# Altium footprint library Connector DSUB.PcbLib: 34 footprints (part 1 of 3)
Each footprint in its own frame and in the unit in brackets; x right, y up, seen from the top. Pads: shape width x height; smd on the part's side, far side on the other; paste and mask are expansions set on the pad; w line width, h text height; cw(c..) or ccw(c..) is an arc to the next point about the centre after c.
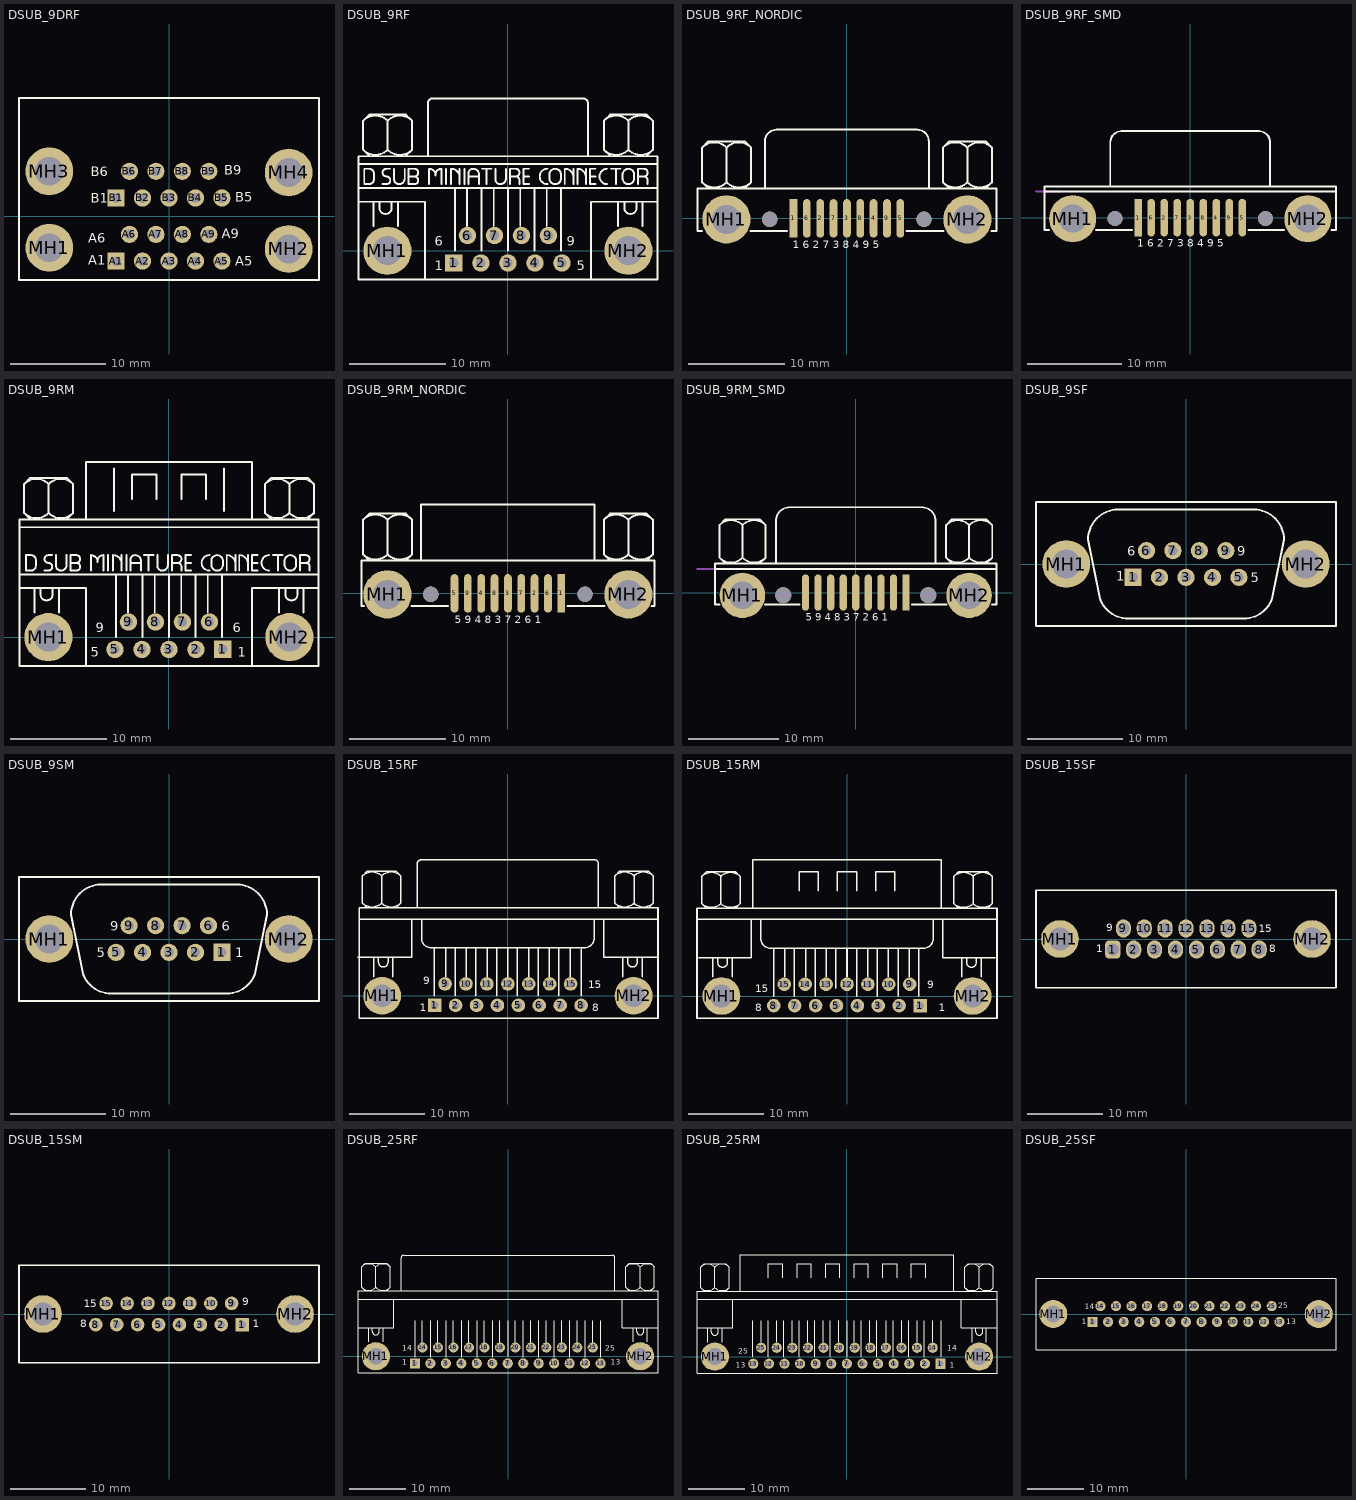
[diagram p0: the footprints below, top view; thin cyan lines are the x and y axes]

## DSUB_9DRF [mm] "CONN, DSUB MINIATURE, DUAL 9PIN, R/A, FEMALE"
pads (22):
  rect 1.8x1.8 hole 1: A1(-5.537,-4.699) B1(-5.537,1.905)
  round 1.8 hole 1: A2(-2.769,-4.699) A3(0,-4.699) A4(2.769,-4.699) A5(5.537,-4.699) A6(-4.14,-1.905) A7(-1.372,-1.905) A8(1.397,-1.905) A9(4.166,-1.905) B2(-2.769,1.905) B3(0,1.905) B4(2.769,1.905) B5(5.537,1.905) B6(-4.14,4.699) B7(-1.372,4.699) B8(1.397,4.699) B9(4.166,4.699)
  round 5 hole 3: MH1(-12.522,-3.302) MH2(12.522,-3.429) MH3(-12.522,4.699) MH4(12.522,4.572)
Top Overlay:
  lines w0.2: -15.697,-6.68 -15.697,12.37 15.697,12.37 15.697,-6.68 -15.697,-6.68
  text "A5" at 6.909,-5.207 h1
  text "A9" at 5.512,-2.286 h1
  text "B5" at 6.909,1.524 h1
  text "B9" at 5.766,4.318 h1
  text "B6" at -8.204,4.191 h1
  text "B1" at -8.204,1.397 h1
  text "A6" at -8.458,-2.794 h1
  text "A1" at -8.458,-5.08 h1

## DSUB_9RF [mm] "CONN, DSUB MINIATURE, 9PIN, R/A, FEMALE"
pads (11):
  rect 1.8x1.8 hole 1 mask+0.1: 1(-5.6,-1.27)
  round 1.8 hole 1 mask+0.1: 2(-2.8,-1.27) 3(0,-1.27) 4(2.8,-1.27) 5(5.6,-1.27) 6(-4.2,1.57) 7(-1.4,1.57) 8(1.4,1.57) 9(4.2,1.57)
  round 5 hole 3: MH1(-12.5,0) MH2(12.5,0)
Top Overlay:
  drawing of 154 lines, arcs and shapes, not listed
  text "9" at 6.107,0.508 h1
  text "5" at 7.123,-2.032 h1
  text "1" at -7.609,-2.032 h1
  text "6" at -7.609,0.508 h1
3D body "D-Sub9rf.stp": height 12.8, standoff -3.65, extent -15.4,-2.9 15.4,15.6

## DSUB_9RF_NORDIC [mm] "CONN, DSUB MINIATURE, 9PIN, R/A, FEMALE, SMD, NORDIC 190-009-263R001"
pads (13):
  rect 0.8x4 smd mask+0.1: 1(-5.54,0)
  oval 0.8x4 smd mask+0.1: 2(-2.77,0) 3(0,0) 4(2.77,0) 5(5.54,0) 6(-4.155,0) 7(-1.385,0) 8(1.385,0) 9(4.155,0)
  round 5 / inner round 3.3 / far side round 5 hole 3 mask+0.1: MH1(-12.5,-0.1) MH2(12.5,-0.1)
  round 1.6 hole 1.6 unplated: ""(-8,-0.1) ""(8,-0.1)
Top Overlay:
  lines w0.2: -15.02,3.744 ccw(c-13.748,5.017) -12.476,3.744 ; -15.02,7.347 cw(c-13.748,6.075) -12.476,7.347 ; -15,-1.3 -15.5,-1.3 -15.5,3.1 15.5,3.1 15.5,-1.3 15,-1.3 ; -14.383,3.112 -15.018,3.747 -15.018,7.345 -14.383,7.98 -10.573,7.98 -9.938,7.345 -9.938,3.747 -10.573,3.112 ; -12.48,3.744 ccw(c-11.208,5.017) -9.936,3.744 ; -12.48,7.347 cw(c-11.208,6.075) -9.936,7.347 ; -12.478,3.747 -12.478,7.345 ; -10,-1.3 -6.2,-1.3 ; -8.5,3.1 -8.5,8 cw(c-7.3,8) -7.3,9.2 7.3,9.2 cw(c7.3,8) 8.5,8 8.5,3.1 ; 6.2,-1.3 10,-1.3 ; 9.957,3.744 ccw(c11.229,5.017) 12.501,3.744 ; 9.957,7.347 cw(c11.229,6.075) 12.501,7.347 ; 10.594,3.112 9.959,3.747 9.959,7.345 10.594,7.98 14.404,7.98 15.039,7.345 15.039,3.747 14.404,3.112 ; 12.497,3.744 ccw(c13.769,5.017) 15.041,3.744 ; 12.497,7.347 cw(c13.769,6.075) 15.041,7.347 ; 12.499,3.747 12.499,7.345
  text "1 6 2 7 3 8 4 9 5" at -5.609,-3.1 h0.8
3D body "190-009-263.STEP": height 10.82, standoff -3.58, extent -15.436,-1.185 15.425,9.127

## DSUB_9RF_SMD [mm] "CONN, DSUB MINIATURE, 9PIN, R/A, FEMALE, KYCON K202XHT-E9S-N"
pads (13):
  rect 0.8x4 smd mask+0.1: 1(-5.54,0)
  oval 0.8x4 smd mask+0.1: 2(-2.77,0) 3(0,0) 4(2.77,0) 5(5.54,0) 6(-4.155,0) 7(-1.385,0) 8(1.385,0) 9(4.155,0)
  round 5 / inner round 3.3 / far side round 5 hole 3 mask+0.1: MH1(-12.5,-0.1) MH2(12.5,-0.1)
  round 1.6 hole 1.6 unplated: ""(-8,-0.1) ""(8,-0.1)
Top Overlay:
  lines w0.2: -15.5,2.8 15.5,2.8 ; -15,-1.3 -15.5,-1.3 -15.5,3.3 15.5,3.3 15.5,-1.3 15,-1.3 ; -10,-1.3 -6.2,-1.3 ; -8.5,3.4 -8.5,8 cw(c-7.3,8) -7.3,9.2 7.3,9.2 cw(c7.3,8) 8.5,8 8.5,3.4 ; 6.2,-1.3 10,-1.3
  text "1 6 2 7 3 8 4 9 5" at -5.609,-3.1 h0.8
Mechanical 1:
  lines w0.2: -16.4,2.8 -13.8,2.8
  text "pcb edge" at -13.5,2.3 h2
3D body "K202XHT-E9S-N_rB2.STEP": height 10.92, standoff -3.32, extent -15.405,-1.1 15.405,9

## DSUB_9RM [mm] "CONN, DSUB MINIATURE, 9PIN, R/A, MALE"
pads (11):
  rect 1.8x1.8 hole 1 mask+0.1: 1(5.6,-1.27)
  round 1.8 hole 1 mask+0.1: 2(2.8,-1.27) 3(0,-1.27) 4(-2.8,-1.27) 5(-5.6,-1.27) 6(4.2,1.57) 7(1.4,1.57) 8(-1.4,1.57) 9(-4.2,1.57)
  round 5 hole 3: MH1(-12.5,0) MH2(12.5,0)
Top Overlay:
  drawing of 160 lines, arcs and shapes, not listed
  text "6" at 6.615,0.508 h1
  text "1" at 7.123,-2.032 h1
  text "5" at -8.117,-2.032 h1
  text "9" at -7.609,0.508 h1
3D body "connector_a-dsub09rm.stp": height 12.57, standoff -4.3, extent -15.405,-2.9 15.405,18

## DSUB_9RM_NORDIC [mm] "CONN, DSUB MINIATURE, 9PIN, R/A, MALE, SMD, NORDIC 190-009-163R001"
pads (13):
  rect 0.8x4 smd mask+0.1: 1(5.54,0)
  oval 0.8x4 smd mask+0.1: 2(2.77,0) 3(0,0) 4(-2.77,0) 5(-5.54,0) 6(4.155,0) 7(1.385,0) 8(-1.385,0) 9(-4.155,0)
  round 5 / inner round 3.3 / far side round 5 hole 3 mask+0.1: MH1(-12.5,-0.1) MH2(12.5,-0.1)
  round 1.6 hole 1.6 unplated: ""(-8,-0.1) ""(8,-0.1)
Top Overlay:
  lines w0.2: -15.02,4.044 ccw(c-13.748,5.317) -12.476,4.044 ; -15.02,7.647 cw(c-13.748,6.375) -12.476,7.647 ; -14.9,-1.3 -15.2,-1.3 -15.2,3.4 15.2,3.4 15.2,-1.3 14.9,-1.3 ; -14.383,3.412 -15.018,4.047 -15.018,7.645 -14.383,8.28 -10.573,8.28 -9.938,7.645 -9.938,4.047 -10.573,3.412 ; -12.48,4.044 ccw(c-11.208,5.317) -9.936,4.044 ; -12.48,7.647 cw(c-11.208,6.375) -9.936,7.647 ; -12.478,4.047 -12.478,7.645 ; -10,-1.3 -6.2,-1.3 ; -9,3.4 -9,9.2 9,9.2 9,3.4 ; 6.2,-1.3 10,-1.3 ; 9.957,4.044 ccw(c11.229,5.317) 12.501,4.044 ; 9.957,7.647 cw(c11.229,6.375) 12.501,7.647 ; 10.594,3.412 9.959,4.047 9.959,7.645 10.594,8.28 14.404,8.28 15.039,7.645 15.039,4.047 14.404,3.412 ; 12.497,4.044 ccw(c13.769,5.317) 15.041,4.044 ; 12.497,7.647 cw(c13.769,6.375) 15.041,7.647 ; 12.499,4.047 12.499,7.645
  text "5 9 4 8 3 7 2 6 1" at -5.5,-3.1 h0.8
3D body "190-009-163.STEP": height 10.82, standoff -3.58, extent -15.049,-1.2 15.049,9.062

## DSUB_9RM_SMD [mm] "CONN, DSUB MINIATURE, 9PIN, R/A, MALE, SMD, KYCON K202XHT-E9P-N"
pads (13):
  rect 0.8x4 smd mask+0.1: 1(5.54,0)
  oval 0.8x4 smd mask+0.1: 2(2.77,0) 3(0,0) 4(-2.77,0) 5(-5.54,0) 6(4.155,0) 7(1.385,0) 8(-1.385,0) 9(-4.155,0)
  round 5 / inner round 3.3 / far side round 5 hole 3 mask+0.1: MH1(-12.5,-0.3) MH2(12.5,-0.3)
  round 1.6 hole 1.8 unplated: ""(-8,-0.3) ""(8,-0.3)
Top Overlay:
  lines w0.2: -15.5,2.6 15.5,2.6 ; -15.02,3.844 ccw(c-13.748,5.117) -12.476,3.844 ; -15.02,7.447 cw(c-13.748,6.175) -12.476,7.447 ; -15,-1.3 -15.5,-1.3 -15.5,3.2 15.5,3.2 15.5,-1.3 15,-1.3 ; -14.383,3.212 -15.018,3.847 -15.018,7.445 -14.383,8.08 -10.573,8.08 -9.938,7.445 -9.938,3.847 -10.573,3.212 ; -12.48,3.844 ccw(c-11.208,5.117) -9.936,3.844 ; -12.48,7.447 cw(c-11.208,6.175) -9.936,7.447 ; -12.478,3.847 -12.478,7.445 ; -10,-1.3 -6.2,-1.3 ; -8.8,3.2 -8.8,7.9 cw(c-7.3,7.9) -7.3,9.4 7.3,9.4 cw(c7.3,7.9) 8.8,7.9 8.8,3.2 ; 6.2,-1.3 10,-1.3 ; 9.957,3.844 ccw(c11.229,5.117) 12.501,3.844 ; 9.957,7.447 cw(c11.229,6.175) 12.501,7.447 ; 10.594,3.212 9.959,3.847 9.959,7.445 10.594,8.08 14.404,8.08 15.039,7.445 15.039,3.847 14.404,3.212 ; 12.497,3.844 ccw(c13.769,5.117) 15.041,3.844 ; 12.497,7.447 cw(c13.769,6.175) 15.041,7.447 ; 12.499,3.847 12.499,7.445
  text "5 9 4 8 3 7 2 6 1" at -5.5,-3.1 h0.8
Mechanical 1:
  lines w0.2: -17.5,2.6 -15.5,2.6
  text "pcb edge" at -15.2,2.2 h2
3D body "K202XHT-E9P-NJ_rB4.STEP": height 10.92, standoff -3.32, extent -15.405,-2.4 15.405,9.249

## DSUB_9SF [mm] "CONN, DSUB MINIATURE, 9PIN, STRAIGHT, FEMALE"
pads (11):
  rect 1.8x1.8 hole 1 mask+0.1: 1(-5.537,-1.397)
  round 1.8 hole 1 mask+0.1: 2(-2.769,-1.397) 3(0,-1.397) 4(2.769,-1.397) 5(5.537,-1.397) 6(-4.14,1.397) 7(-1.372,1.397) 8(1.397,1.397) 9(4.166,1.397)
  round 5 hole 3: MH1(-12.522,0) MH2(12.522,0)
Top Overlay:
  lines w0.2: -6.05,-5.7 cw(c-6.05,-2.55) -9.01,-3.627 -10.25,2.55 cw(c-7.1,2.55) -7.1,5.7 7.1,5.7 cw(c7.1,2.55) 10.25,2.55 9.01,-3.627 cw(c6.05,-2.55) 6.05,-5.7 ; -6,-5.7 6,-5.7 ; -15.697,-6.477 -15.697,6.477 15.697,6.477 15.697,-6.477 -15.697,-6.477
  text "1" at -7.315,-1.778 h1
  text "6" at -6.172,0.889 h1
  text "5" at 6.782,-1.905 h1
  text "9" at 5.385,0.889 h1

## DSUB_9SM [mm] "CONN, DSUB MINIATURE, 9PIN, STRAIGHT, MALE"
pads (11):
  rect 1.8x1.8 hole 1 mask+0.1: 1(5.537,-1.397)
  round 1.8 hole 1 mask+0.1: 2(2.769,-1.397) 3(0,-1.397) 4(-2.769,-1.397) 5(-5.537,-1.397) 6(4.14,1.397) 7(1.372,1.397) 8(-1.397,1.397) 9(-4.166,1.397)
  round 5 hole 3: MH1(-12.522,0) MH2(12.522,0)
Top Overlay:
  lines w0.2: -6.05,-5.7 cw(c-6.05,-2.55) -9.01,-3.627 -10.25,2.55 cw(c-7.1,2.55) -7.1,5.7 7.1,5.7 cw(c7.1,2.55) 10.25,2.55 9.01,-3.627 cw(c6.05,-2.55) 6.05,-5.7 ; -6,-5.7 6,-5.7 ; -15.697,-6.477 -15.697,6.477 15.697,6.477 15.697,-6.477 -15.697,-6.477
  text "6" at 5.537,0.889 h1
  text "1" at 6.934,-1.905 h1
  text "9" at -6.147,0.889 h1
  text "5" at -7.544,-1.905 h1

## DSUB_15RF [mm] "CONN, DSUB MINIATURE, 15PIN, R/A, FEMALE"
pads (17):
  rect 1.8x1.8 hole 1 mask+0.1: 1(-9.694,-1.27)
  round 1.8 hole 1 mask+0.1: 2(-6.921,-1.27) 3(-4.149,-1.27) 4(-1.376,-1.27) 5(1.397,-1.27) 6(4.17,-1.27) 7(6.943,-1.27) 8(9.716,-1.27) 9(-8.318,1.57) 10(-5.546,1.57) 11(-2.773,1.57) 12(0,1.57) 13(2.773,1.57) 14(5.546,1.57) 15(8.319,1.57)
  round 5 hole 3: MH1(-16.658,0) MH2(16.658,0)
Top Overlay:
  lines w0.2: -19.854,5.08 -12.7,5.08 -12.7,10.16 ; -19.7,10.16 19.897,10.16 ; -19.264,12.274 ccw(c-17.992,13.547) -16.719,12.274 ; -19.264,15.877 cw(c-17.992,14.605) -16.719,15.877 ; -18.627,11.642 -19.262,12.277 -19.262,15.875 -18.627,16.51 -14.817,16.51 -14.182,15.875 -14.182,12.277 -14.817,11.642 ; -17.78,2.54 -17.78,5.08 ; -17.145,5.08 -17.145,4.445 ccw(c-16.51,4.445) -15.875,4.445 -15.875,5.08 ; -16.724,12.274 ccw(c-15.452,13.547) -14.179,12.274 ; -16.724,15.877 cw(c-15.452,14.605) -14.179,15.877 ; -16.722,12.277 -16.722,15.875 ; -15.24,2.54 -15.24,5.08 ; -12,11.655 -12,17.5 cw(c-11.5,17.5) -11.5,18 11.5,18 cw(c11.5,17.5) 12,17.5 12,11.642 ; -11.43,10.16 -11.43,7.62 ccw(c-10.16,7.62) -10.16,6.35 10.16,6.35 ccw(c10.16,7.62) 11.43,7.62 11.43,10.16 ; -9.737,0 -9.737,6.35 ; -8.255,2.54 -8.255,6.35 ; -6.985,0 -6.985,6.35 ; -5.503,2.54 -5.503,6.35 ; -4.233,0 -4.233,6.35 ; -2.752,2.54 -2.752,6.35 ; -1.482,0 -1.482,6.35 ; 0,2.54 0,6.35 ; 1.27,0 1.27,6.35 ; 2.752,2.54 2.752,6.35 ; 4.022,0 4.022,6.35 ; 5.503,2.54 5.503,6.35 ; 6.773,0 6.773,6.35 ; 8.255,2.54 8.255,6.35 ; 9.737,0 9.737,6.138 ; 12.7,10.16 12.7,5.08 19.897,5.08 ; 14.179,12.274 ccw(c15.452,13.547) 16.724,12.274 ; 14.179,15.877 cw(c15.452,14.605) 16.724,15.877 ; 14.817,11.642 14.182,12.277 14.182,15.875 14.817,16.51 18.627,16.51 19.262,15.875 19.262,12.277 18.627,11.642 ; 15.24,2.54 15.24,5.08 ; 15.875,5.08 15.875,4.445 ccw(c16.51,4.445) 17.145,4.445 17.145,5.08 ; 16.719,12.274 ccw(c17.992,13.547) 19.264,12.274 ; 16.719,15.877 cw(c17.992,14.605) 19.264,15.877 ; 16.722,12.277 16.722,15.875 ; 17.78,2.54 17.78,5.08 ; -19.7,-2.963 -19.7,11.642 19.897,11.642 19.897,-2.963 -19.7,-2.963
  text "8" at 11.176,-2.032 h1
  text "15" at 10.668,1.016 h1
  text "9" at -11.176,1.524 h1
  text "1" at -11.684,-2.032 h1
3D body "connector_a-dsub_15rf_a_kg-t1.stp": height 12.57, standoff -4.3, extent -19.57,-2.9 19.57,17.9

## DSUB_15RM [mm] "CONN, DSUB MINIATURE, 15PIN, R/A, MALE"
pads (17):
  rect 1.8x1.8 hole 1 mask+0.1: 1(9.694,-1.27)
  round 1.8 hole 1 mask+0.1: 2(6.921,-1.27) 3(4.149,-1.27) 4(1.376,-1.27) 5(-1.397,-1.27) 6(-4.17,-1.27) 7(-6.943,-1.27) 8(-9.716,-1.27) 9(8.319,1.57) 10(5.546,1.57) 11(2.773,1.57) 12(0,1.57) 13(-2.773,1.57) 14(-5.546,1.57) 15(-8.319,1.57)
  round 5 hole 3: MH1(-16.658,0) MH2(16.658,0)
Top Overlay:
  lines w0.2: -19.897,10.16 19.897,10.16 ; -19.685,5.08 -12.7,5.08 -12.7,10.16 ; -19.264,12.274 ccw(c-17.992,13.547) -16.719,12.274 ; -19.264,15.877 cw(c-17.992,14.605) -16.719,15.877 ; -18.627,11.642 -19.262,12.277 -19.262,15.875 -18.627,16.51 -14.817,16.51 -14.182,15.875 -14.182,12.277 -14.817,11.642 ; -17.78,2.54 -17.78,5.08 ; -17.145,5.08 -17.145,4.445 ccw(c-16.51,4.445) -15.875,4.445 -15.875,5.08 ; -16.724,12.274 ccw(c-15.452,13.547) -14.179,12.274 ; -16.724,15.877 cw(c-15.452,14.605) -14.179,15.877 ; -16.722,12.277 -16.722,15.875 ; -15.24,2.54 -15.24,5.08 ; -12.5,11.755 -12.5,18.1 12.5,18.1 12.5,11.742 ; -11.43,10.16 -11.43,7.62 ccw(c-10.16,7.62) -10.16,6.35 10.16,6.35 ccw(c10.16,7.62) 11.43,7.62 11.43,10.16 ; -9.737,0 -9.737,6.35 ; -8.255,2.54 -8.255,6.35 ; -6.985,0 -6.985,6.35 ; -6.35,13.97 -6.35,16.51 -3.81,16.51 -3.81,13.97 ; -5.503,2.54 -5.503,6.35 ; -4.233,0 -4.233,6.35 ; -2.752,2.54 -2.752,6.35 ; -1.482,1.058 -1.482,6.35 ; -1.27,13.97 -1.27,16.51 1.27,16.51 1.27,13.97 ; 0,2.54 0,6.35 ; 1.27,0 1.27,6.35 ; 2.752,2.54 2.752,6.35 ; 3.81,13.97 3.81,16.51 6.35,16.51 6.35,13.97 ; 4.022,0 4.022,6.35 ; 5.503,2.54 5.503,6.35 ; 6.773,0 6.773,6.35 ; 8.255,2.54 8.255,6.35 ; 9.525,0 9.525,6.35 ; 12.7,10.16 12.7,5.08 19.685,5.08 ; 14.179,12.274 ccw(c15.452,13.547) 16.724,12.274 ; 14.179,15.877 cw(c15.452,14.605) 16.724,15.877 ; 14.817,11.642 14.182,12.277 14.182,15.875 14.817,16.51 18.627,16.51 19.262,15.875 19.262,12.277 18.627,11.642 ; 15.24,2.54 15.24,5.08 ; 15.875,5.08 15.875,4.445 ccw(c16.51,4.445) 17.145,4.445 17.145,5.08 ; 16.719,12.274 ccw(c17.992,13.547) 19.264,12.274 ; 16.719,15.877 cw(c17.992,14.605) 19.264,15.877 ; 16.722,12.277 16.722,15.875 ; 17.78,2.54 17.78,5.08 ; -19.897,-2.963 -19.897,11.642 19.897,11.642 19.897,-2.963 -19.897,-2.963
  text "15" at -12.192,0.508 h1
  text "8" at -12.192,-2.032 h1
  text "1" at 12.192,-2.032 h1
  text "9" at 10.668,1.016 h1
3D body "dsub15rm_a_kg-t1.stp": height 12.57, standoff -4.3, extent -19.57,-2.9 19.57,18

## DSUB_15SF [mm] "CONN, DSUB MINIATURE, 15PIN, STRAIGHT, FEMALE (SOCKET)"
pads (17):
  rrect50% 2x2.4 hole 1.6 mask+0.1: 1(-9.69,-1.397)
  oval 2x2.4 hole 1.6 mask+0.1: 2(-6.921,-1.397) 3(-4.153,-1.397) 4(-1.384,-1.397) 5(1.384,-1.397) 6(4.153,-1.397) 7(6.921,-1.397) 8(9.69,-1.397) 9(-8.293,1.397) 10(-5.524,1.397) 11(-2.756,1.397) 12(0.013,1.397) 13(2.781,1.397) 14(5.55,1.397) 15(8.319,1.397)
  round 5 hole 3: MH1(-16.675,0) MH2(16.675,0)
Top Overlay:
  lines w0.2: -19.85,-6.477 19.85,-6.477 19.85,6.477 -19.85,6.477 -19.85,-6.477
  text "15" at 9.614,0.889 h1
  text "9" at -10.579,1.016 h1
  text "8" at 11.011,-1.778 h1
  text "1" at -11.849,-1.778 h1
3D body "DB15SF.stp": height 13.23, standoff -1.27, extent -19.505,-6.21 19.505,6.21

## DSUB_15SM [mm] "CONN, DSUB MINIATURE, 15PIN, STRAIGHT, MALE"
pads (17):
  rect 1.8x1.8 hole 1 mask+0.1: 1(9.69,-1.397)
  round 1.8 hole 1 mask+0.1: 2(6.921,-1.397) 3(4.153,-1.397) 4(1.384,-1.397) 5(-1.384,-1.397) 6(-4.153,-1.397) 7(-6.921,-1.397) 8(-9.69,-1.397) 9(8.293,1.397) 10(5.524,1.397) 11(2.756,1.397) 12(-0.013,1.397) 13(-2.781,1.397) 14(-5.55,1.397) 15(-8.319,1.397)
  round 5 hole 3: MH1(-16.675,0) MH2(16.675,0)
Top Overlay:
  lines w0.2: -19.85,-6.477 -19.85,6.477 19.85,6.477 19.85,-6.477 -19.85,-6.477
  text "8" at -11.773,-1.778 h1
  text "1" at 11.087,-1.778 h1
  text "9" at 9.69,1.143 h1
  text "15" at -11.265,0.889 h1

## DSUB_25RF [mm] "CONN, DSUB MINIATURE, 25 WAY, RIGHT-ANGLE, FEMALE"
pads (27):
  rect 1.8x1.8 hole 1 mask+0.1: 1(-16.552,-1.27)
  round 1.8 hole 1 mask+0.1: 2(-13.801,-1.27) 3(-11.049,-1.27) 4(-8.297,-1.27) 5(-5.546,-1.27) 6(-2.794,-1.27) 7(-0.042,-1.27) 8(2.709,-1.27) 9(5.461,-1.27) 10(8.213,-1.27) 11(10.964,-1.27) 12(13.716,-1.27) 13(16.468,-1.27) 14(-15.198,1.57) 15(-12.446,1.57) 16(-9.694,1.57) 17(-6.943,1.57) 18(-4.191,1.57) 19(-1.439,1.57) 20(1.312,1.57) 21(4.064,1.57) 22(6.816,1.57) 23(9.567,1.57) 24(12.319,1.57) 25(15.071,1.57)
  round 5 hole 3: MH1(-23.495,0) MH2(23.495,0)
Top Overlay:
  lines w0.2: -26.67,5.08 -20.32,5.08 -20.32,10.16 ; -26.67,10.16 26.67,10.16 ; -26.037,12.274 ccw(c-24.765,13.547) -23.493,12.274 ; -26.037,15.877 cw(c-24.765,14.605) -23.493,15.877 ; -25.4,11.642 -26.035,12.277 -26.035,15.875 -25.4,16.51 -21.59,16.51 -20.955,15.875 -20.955,12.277 -21.59,11.642 ; -24.765,2.54 -24.765,5.08 ; -24.13,5.08 -24.13,4.445 ccw(c-23.495,4.445) -22.86,4.445 -22.86,5.08 ; -23.497,12.274 ccw(c-22.225,13.547) -20.953,12.274 ; -23.497,15.877 cw(c-22.225,14.605) -20.953,15.877 ; -23.495,12.277 -23.495,15.875 ; -22.225,2.54 -22.225,5.08 ; -19,11.655 -19,17.5 cw(c-18.5,17.5) -18.5,18 18.5,18 cw(c18.5,17.5) 19,17.5 19,11.642 ; -16.51,-0.212 -16.51,6.35 ; -15.24,2.328 -15.24,6.35 ; -13.758,-0.212 -13.758,6.35 ; -12.488,2.328 -12.488,6.35 ; -11.007,-0.212 -11.007,6.35 ; -9.737,2.328 -9.737,6.35 ; -8.255,-0.212 -8.255,6.35 ; -6.985,2.328 -6.985,6.35 ; -5.503,-0.212 -5.503,6.35 ; -4.233,2.328 -4.233,6.35 ; -2.752,-0.212 -2.752,6.35 ; -1.482,2.328 -1.482,6.35 ; 0,0 0,6.35 ; 1.27,2.328 1.27,6.35 ; 2.752,-0.212 2.752,6.35 ; 4.022,2.328 4.022,6.35 ; 5.503,-0.212 5.503,6.35 ; 6.773,2.328 6.773,6.35 ; 8.255,-0.212 8.255,6.35 ; 9.525,2.328 9.525,6.35 ; 11.007,-0.212 11.007,6.35 ; 12.277,2.328 12.277,6.35 ; 13.758,-0.212 13.758,6.35 ; 15.028,2.328 15.028,6.35 ; 16.51,-0.212 16.51,6.35 ; 20.32,10.16 20.32,5.08 26.67,5.08 ; 20.953,12.274 ccw(c22.225,13.547) 23.497,12.274 ; 20.953,15.877 cw(c22.225,14.605) 23.497,15.877 ; 21.59,11.642 20.955,12.277 20.955,15.875 21.59,16.51 25.4,16.51 26.035,15.875 26.035,12.277 25.4,11.642 ; 22.225,2.54 22.225,5.08 ; 22.86,5.08 22.86,4.445 ccw(c23.495,4.445) 24.13,4.445 24.13,5.08 ; 23.493,12.274 ccw(c24.765,13.547) 26.037,12.274 ; 23.493,15.877 cw(c24.765,14.605) 26.037,15.877 ; 23.495,12.277 23.495,15.875 ; 24.765,2.54 24.765,5.08 ; -26.67,-2.963 26.67,-2.963 26.67,11.642 -26.67,11.642 -26.67,-2.963
  text "1" at -18.796,-1.524 h1
  text "14" at -18.796,1.016 h1
  text "25" at 17.272,1.016 h1
  text "13" at 18.288,-1.524 h1
3D body "connector_a-DSUB25RF_a_kg-t1.stp": height 12.57, standoff -4.3, extent -26.62,-2.9 26.42,17.9

## DSUB_25RM [mm] "CONN, DSUB MINIATURE, 25 WAY, RIGHT-ANGLE, MALE"
pads (27):
  rect 1.8x1.8 hole 1 mask+0.1: 1(16.616,-1.27)
  round 1.8 hole 1 mask+0.1: 2(13.843,-1.27) 3(11.07,-1.27) 4(8.297,-1.27) 5(5.525,-1.27) 6(2.752,-1.27) 7(-0.021,-1.27) 8(-2.794,-1.27) 9(-5.567,-1.27) 10(-8.34,-1.27) 11(-11.112,-1.27) 12(-13.885,-1.27) 13(-16.658,-1.27) 14(15.24,1.57) 15(12.467,1.57) 16(9.694,1.57) 17(6.922,1.57) 18(4.149,1.57) 19(1.376,1.57) 20(-1.397,1.57) 21(-4.17,1.57) 22(-6.943,1.57) 23(-9.715,1.57) 24(-12.488,1.57) 25(-15.261,1.57)
  round 5 hole 3: MH1(-23.495,0) MH2(23.495,0)
Top Overlay:
  lines w0.2: -26.67,5.08 -20.32,5.08 -20.32,10.16 ; -26.67,10.16 26.67,10.16 ; -26.037,12.274 ccw(c-24.765,13.547) -23.493,12.274 ; -26.037,15.877 cw(c-24.765,14.605) -23.493,15.877 ; -25.4,11.642 -26.035,12.277 -26.035,15.875 -25.4,16.51 -21.59,16.51 -20.955,15.875 -20.955,12.277 -21.59,11.642 ; -24.765,2.54 -24.765,5.08 ; -24.13,5.08 -24.13,4.445 ccw(c-23.495,4.445) -22.86,4.445 -22.86,5.08 ; -23.497,12.274 ccw(c-22.225,13.547) -20.953,12.274 ; -23.497,15.877 cw(c-22.225,14.605) -20.953,15.877 ; -23.495,12.277 -23.495,15.875 ; -22.225,2.54 -22.225,5.08 ; -19,11.642 -19,18.1 19,18.1 19,11.642 ; -16.722,0 -16.722,6.35 ; -15.24,2.54 -15.24,6.35 ; -13.97,0 -13.97,6.35 ; -13.97,13.97 -13.97,16.51 -11.43,16.51 -11.43,13.97 ; -12.488,2.54 -12.488,6.35 ; -11.218,0 -11.218,6.35 ; -9.737,2.54 -9.737,6.35 ; -8.89,13.97 -8.89,16.51 -6.35,16.51 -6.35,13.97 ; -8.467,0 -8.467,6.35 ; -6.985,2.54 -6.985,6.35 ; -5.715,0 -5.715,6.35 ; -4.233,2.54 -4.233,6.35 ; -3.81,13.97 -3.81,16.51 -1.27,16.51 -1.27,13.97 ; -2.963,0 -2.963,6.35 ; -1.482,2.54 -1.482,6.35 ; 0,0 0,6.35 ; 1.27,2.54 1.27,6.35 ; 1.27,13.97 1.27,16.51 3.81,16.51 3.81,13.97 ; 2.54,0 2.54,6.35 ; 4.022,2.54 4.022,6.35 ; 5.292,0 5.292,6.35 ; 6.35,13.97 6.35,16.51 8.89,16.51 8.89,13.97 ; 6.985,2.54 6.985,6.35 ; 8.255,0 8.255,6.35 ; 9.737,2.54 9.737,6.35 ; 11.007,0 11.007,6.35 ; 11.43,13.97 11.43,16.51 13.97,16.51 13.97,13.97 ; 12.488,2.54 12.488,6.35 ; 13.758,0 13.758,6.35 ; 15.24,2.54 15.24,6.35 ; 16.722,0 16.722,6.35 ; 20.32,10.16 20.32,5.08 26.67,5.08 ; 20.953,12.274 ccw(c22.225,13.547) 23.497,12.274 ; 20.953,15.877 cw(c22.225,14.605) 23.497,15.877 ; 21.59,11.642 20.955,12.277 20.955,15.875 21.59,16.51 25.4,16.51 26.035,15.875 26.035,12.277 25.4,11.642 ; 22.225,2.54 22.225,5.08 ; 22.86,5.08 22.86,4.445 ccw(c23.495,4.445) 24.13,4.445 24.13,5.08 ; 23.493,12.274 ccw(c24.765,13.547) 26.037,12.274 ; 23.493,15.877 cw(c24.765,14.605) 26.037,15.877 ; 23.495,12.277 23.495,15.875 ; 24.765,2.54 24.765,5.08 ; -26.67,-2.963 26.67,-2.963 26.67,11.642 -26.67,11.642 -26.67,-2.963
  text "25" at -19.304,0.508 h1
  text "13" at -19.812,-2.032 h1
  text "1" at 18.288,-2.032 h1
  text "14" at 17.78,1.016 h1
3D body "connector_a-DSUB25RM_a_kg-t1.stp": height 12.57, standoff -4.3, extent -26.54,-2.9 26.5,18

## DSUB_25SF [mm] "CONN, DSUB MINIATURE, 25PIN, STRAIGHT, FEMALE (SOCKET)"
pads (27):
  rect 1.8x1.8 hole 1 mask+0.1: 1(-16.612,-1.397)
  round 1.8 hole 1 mask+0.1: 2(-13.843,-1.397) 3(-11.074,-1.397) 4(-8.306,-1.397) 5(-5.537,-1.397) 6(-2.769,-1.397) 7(0,-1.397) 8(2.769,-1.397) 9(5.537,-1.397) 10(8.306,-1.397) 11(11.074,-1.397) 12(13.843,-1.397) 13(16.612,-1.397) 14(-15.215,1.397) 15(-12.446,1.397) 16(-9.677,1.397) 17(-6.909,1.397) 18(-4.14,1.397) 19(-1.372,1.397) 20(1.397,1.397) 21(4.166,1.397) 22(6.934,1.397) 23(9.703,1.397) 24(12.471,1.397) 25(15.24,1.397)
  round 5 hole 3: MH1(-23.597,0) MH2(23.597,0)
Top Overlay:
  lines w0.2: -26.67,-6.35 -26.67,6.35 26.67,6.35 26.67,-6.35 -26.67,-6.35
  text "1" at -18.517,-1.778 h1
  text "13" at 17.805,-1.778 h1
  text "14" at -18.009,0.889 h1
  text "25" at 16.408,1.016 h1